# Altium footprint library Library.PcbLib: 308 footprints (part 6 of 21)
Each footprint in its own frame and in the unit in brackets; x right, y up, seen from the top. Pads: shape width x height; smd on the part's side, far side on the other; paste and mask are expansions set on the pad; w line width, h text height; cw(c..) or ccw(c..) is an arc to the next point about the centre after c.
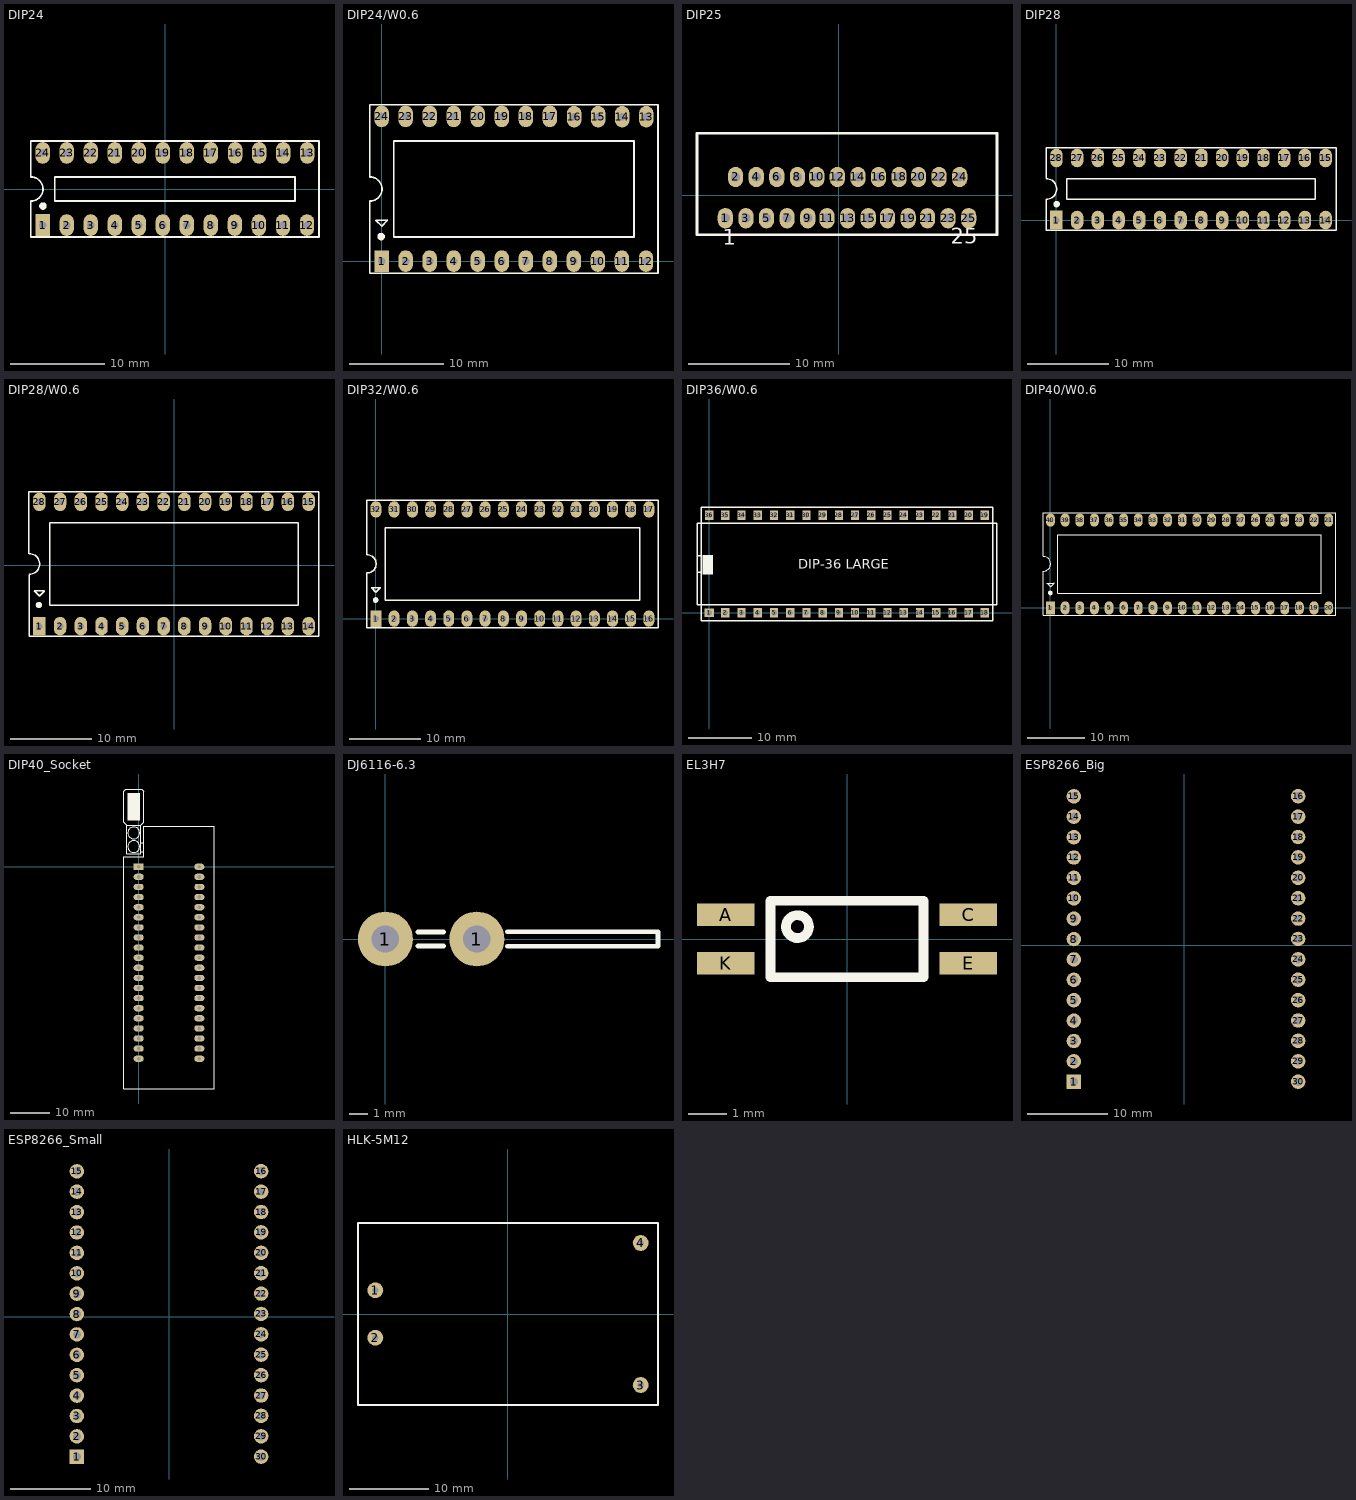
[diagram p5: the footprints below, top view; thin cyan lines are the x and y axes]

## DIP24 [mil]
height 100
pads (24):
  rect 60x90 hole 31: 1(-510,-150)
  oval 60x90 hole 31: 2(-410,-150) 3(-310,-150) 4(-210,-150) 5(-110,-150) 6(-10,-150) 7(90,-150) 8(190,-150) 9(290,-150) 10(390,-150) 11(490,-150) 12(590,-150) 13(591,150) 14(491,150) 15(391,150) 16(291,150) 17(190,150) 18(90,150) 19(-10,150) 20(-110,150) 21(-210,150) 22(-310,150) 23(-410,150) 24(-510,150)
Top Overlay:
  circle w15: c-509,-71 r8
  lines w7: -560.38,-49.95 ccw(c-558.68,0.02) -560,50 ; -560,-50 -560,-200 640,-200 640,200 -560,200 -560,51 ; -460,-50 -460,50 540,50 540,-50 -460,-50
3D body "SW3dPS-DIP24-300.STEP": height 200, standoff -98.03, extent -599.04,-152.92 671.04,156.92

## DIP24/W0.6 [mil] "DIP24/W.600, Pin to pin 100mil"
height 100
pads (24):
  rect 60x90 hole 31: 1(0,0)
  oval 60x90 hole 31: 2(100,0) 3(200,0) 4(300,0) 5(400,0) 6(500,0) 7(600,0) 8(700,0) 9(800,0) 10(900,0) 11(1000,0) 12(1100,0) 13(1101,601) 14(1001,601) 15(901,601) 16(801,601) 17(700,602) 18(600,602) 19(500,602) 20(400,602) 21(300,602) 22(200,602) 23(100,602) 24(0,602)
Top Overlay:
  circle w15: c-2,102 r8
  lines w7: -50,350 -50,650 1150,650 1150,-50 -50,-50 -50,250 ccw(c-48.31,299.97) -49.62,349.95 ; -25,170 23,170 24,171 24,169 0,145 0,146 -24,170 -25,170 ; 50,100 50,500 1050,500 1050,100 50,100
3D body "SW3DPS-DIP 24 IC WITH 0_280IN WINDOW-DEFAULT.STEP": height 227.95, standoff -129.92, extent -82.52,0.16 1202.52,600

## DIP25 [mm]
height 21
pads (25):
  oval 1.5x2 hole 0.9: 1(-11.176,-2.286) 2(-10.16,1.778) 3(-9.144,-2.286) 4(-8.128,1.778) 5(-7.112,-2.286) 6(-6.096,1.778) 7(-5.08,-2.286) 8(-4.064,1.778) 9(-3.048,-2.286) 10(-2.159,1.778) 11(-1.143,-2.286) 12(-0.127,1.778) 13(0.889,-2.286) 14(1.905,1.778) 15(2.921,-2.286) 16(3.937,1.778) 17(4.826,-2.286) 18(5.969,1.778) 19(6.858,-2.286) 20(7.874,1.778) 21(8.763,-2.286) 22(9.906,1.778) 23(10.795,-2.286) 24(11.938,1.778) 25(12.827,-2.286)
Top Overlay:
  lines w0.254: -13.97,-3.937 -13.97,6.096 15.621,6.096 15.621,-3.937 -13.97,-3.937
  text "25" at 11.049,-4.826 h1.5
  text "1" at -11.406,-4.911 h1.5
3D body "User Library-TDA73XX.step": height 20.95, standoff -1.92, extent -13.761,-2.54 15.539,5.97

## DIP28 [mil] "DIP, 18-Leads, Row Spacing 7.62mm, Pitch 2.54mm, Body 22.8x7.3mm, Window"
height 100
pads (28):
  rect 60x90 hole 31: 1(0,0)
  oval 60x90 hole 31: 2(100,0) 3(200,0) 4(300,0) 5(400,0) 6(500,0) 7(600,0) 8(700,0) 9(800,0) 10(900,0) 11(1000,0) 12(1100,0) 13(1200,0) 14(1300,0) 15(1300,300) 16(1200,300) 17(1100,300) 18(1000,300) 19(900,300) 20(800,300) 21(700,300) 22(600,300) 23(500,300) 24(400,300) 25(300,300) 26(200,300) 27(100,300) 28(0,300)
Top Overlay:
  circle w15: c1,77 r8
  lines w7: -50.38,100.05 ccw(c-48.69,150.02) -50,200 ; -50,100 -50,-50 1350,-50 1350,350 -50,350 -50,201 ; 50,100 1250,100 1250,200 50,200 50,100
3D body "SW3dPS-DIP28-300.STEP": height 200, standoff -98.03, extent -50,-10 1367.32,299.84

## DIP28/W0.6 [mil] "DIP28/W.600, Pin to pin 100mil"
height 100
pads (28):
  rect 60x90 hole 31: 1(-650,-295)
  oval 60x90 hole 31: 2(-550,-295) 3(-450,-295) 4(-350,-295) 5(-250,-295) 6(-150,-295) 7(-50,-295) 8(50,-295) 9(150,-295) 10(250,-295) 11(350,-295) 12(450,-295) 13(550,-295) 14(650,-295) 15(650,305) 16(550,305) 17(450,305) 18(350,305) 19(250,305) 20(150,305) 21(50,305) 22(-50,305) 23(-150,305) 24(-250,305) 25(-350,305) 26(-450,305) 27(-550,305) 28(-650,305)
Top Overlay:
  circle w15: c-652,-193 r8
  lines w7: -701,55 -701,355 700,355 700,-345 -700,-345 -700,-46 ; -700,-45 ccw(c-698.31,4.97) -699.62,54.95 ; -675,-125 -627,-125 -626,-124 -626,-126 -650,-150 -650,-149 -674,-125 -675,-125 ; -600,-195 -600,205 600,205 600,-195 -600,-195
3D body "SW3dPS-DIP28-600.STEP": height 224.41, standoff -101.57, extent -734.25,-294.84 734.25,315

## DIP32/W0.6 [mil] "DIP32/W.600, Pin to pin 100mil"
height 100
pads (32):
  rect 60x90 hole 31: 1(0,0)
  oval 60x90 hole 31: 2(100,0) 3(200,0) 4(300,0) 5(400,0) 6(500,0) 7(600,0) 8(700,0) 9(800,0) 10(900,0) 11(1000,0) 12(1100,0) 13(1200,0) 14(1300,0) 15(1400,0) 16(1500,0) 17(1500,600) 18(1400,600) 19(1300,600) 20(1200,600) 21(1100,600) 22(1000,600) 23(900,600) 24(800,600) 25(700,600) 26(600,600) 27(500,600) 28(400,600) 29(300,600) 30(200,600) 31(100,600) 32(0,600)
Top Overlay:
  circle w15: c-2,102 r8
  lines w7: -50.38,251.05 ccw(c-48.69,301.02) -50,351 ; -50,251 -50,-50 1550,-50 1550,650 -50,650 -50,352 ; -25,170 -24,170 0,146 0,145 24,169 24,171 23,170 -25,170 ; 50,100 50,500 1450,500 1450,100 50,100
3D body "SW3DPS-DIP 32 IC WITH 0_380IN WINDOW-DEFAULT.STEP": height 227.95, standoff -129.92, extent -77.56,0 1577.56,601.81

## DIP36/W0.6 [mil]
pads (36):
  rect 59x51 / inner rect 58x58 / far side rect 59x51 hole 34: 1(0,0)
  rect 51x59 / inner round 58 / far side rect 51x59 hole 34: 2(100,0) 3(200,0) 4(300,0) 5(400,0) 6(500,0) 7(600,0) 8(700,0) 9(800,0) 10(900,0) 11(1000,0) 12(1100,0) 13(1200,0) 14(1300,0) 15(1400,0) 16(1500,0) 17(1600,0) 18(1700,0) 19(1700,600) 20(1600,600) 21(1500,600) 22(1400,600) 23(1300,600) 24(1200,600) 25(1100,600) 26(1000,600) 27(900,600) 28(800,600) 29(700,600) 30(600,600) 31(500,600) 32(400,600) 33(300,600) 34(200,600) 35(100,600) 36(0,600)
Top Overlay:
  region: 22.4,236.65 22.4,356.73 -40,356.73 -40,236.65
  lines w8: -75,50 -75,250 ; -75,50 1775,50 ; -75,50 -75,250 ; -75,50 1775,50 ; -75,250 -50,250 ; -75,250 -75,350 ; -75,250 -50,250 ; -75,250 -75,350 ; -75,350 -50,350 ; -75,350 -75,550 ; -75,350 -50,350 ; -75,350 -75,550 ; -75,550 1775,550 ; -75,550 1775,550 ; -50,250 -50,350 ; -50,250 -50,350 ; -50,350 -50,650 1750,650 1750,-50 -50,-50 -50,350 ; 1775,50 1775,550 ; 1775,50 1775,550
  text "DIP-36 LARGE" at 550,270 h59.05
3D body: height 118.11, standoff 0, extent -75,50 1775,547.5
3D body "61301811021.stp": height 100.39, standoff -117.72, extent -50,206.06 1750,613.94
3D body "61301811021.stp": height 100.39, standoff -117.72, extent -50,-13.94 1750,393.94
3D body: height 119.11, standoff 118.11, extent -24.98,74.93 -4.99,94.93
3D body: height 120.08, standoff 0, extent -37,230 29,361

## DIP40/W0.6 [mil] "40 PIN, W 600mil, Pin to pin 100mil"
height 100
pads (40):
  rect 60x90 hole 31: 1(0,0)
  oval 60x90 hole 31: 2(100,0) 3(200,0) 4(300,0) 5(400,0) 6(500,0) 7(600,0) 8(700,0) 9(800,0) 10(900,0) 11(1000,0) 12(1100,0) 13(1200,0) 14(1300,0) 15(1400,0) 16(1500,0) 17(1600,0) 18(1700,0) 19(1800,0) 20(1900,0) 21(1900,600) 22(1800,600) 23(1700,600) 24(1600,600) 25(1500,600) 26(1400,600) 27(1300,600) 28(1200,600) 29(1100,600) 30(1000,600) 31(900,600) 32(800,600) 33(700,600) 34(600,600) 35(500,600) 36(400,600) 37(300,600) 38(200,600) 39(100,600) 40(0,600)
Top Overlay:
  circle w15: c-1,102 r8
  lines w7: -50.38,251.05 ccw(c-48.69,301.02) -50,351 ; -50,251 -50,-50 1950,-50 1950,650 -50,650 -50,352 ; -24,170 -23,170 1,146 1,145 25,169 25,171 24,170 -24,170 ; 50,100 1850,100 1850,500 50,500 50,100
3D body "SW3dPS-DIP40-600.STEP": height 224.41, standoff -101.57, extent -82.48,-10 1982.48,599.84

## DIP40_Socket [mil] "40 PIN, W 900 mil , L 2600 mil , Push Pro FOR Chip"
height 300
pads (40):
  rect 100x62 hole 38: 1(0,0)
  oval 100x62 hole 38: 2(0,-100) 3(0,-200) 4(0,-300) 5(0,-400) 6(0,-500) 7(0,-600) 8(0,-700) 9(0,-800) 10(0,-900) 11(0,-1000) 12(0,-1100) 13(0,-1200) 14(0,-1300) 15(0,-1400) 16(0,-1500) 17(0,-1600) 18(0,-1700) 19(0,-1800) 20(0,-1900) 21(600,-1900) 22(600,-1800) 23(600,-1700) 24(600,-1600) 25(600,-1500) 26(600,-1400) 27(600,-1300) 28(600,-1200) 29(600,-1100) 30(600,-1000) 31(600,-900) 32(600,-800) 33(600,-700) 34(600,-600) 35(600,-500) 36(600,-400) 37(600,-300) 38(600,-200) 39(600,-100) 40(600,0)
Top Overlay:
  circle w7: c-48.31,335 r58.31
  circle w7: c-48.31,200 r58.31
  rectangle: -110,460 15,730
  lines w7: 20,150 50,150 ; 20,240 50,240 ; -120,410 -120,130 -110,130 20,130 20,410 ; -120,410 -150,440 -150,750 -130,770 30,770 50,750 50,440 20,410 ; -120,410 20,410 ; -150,-2200 -150,100 50,100 50,400 600,400 750,400 750,-2200 -150,-2200
3D body "SW3dPS-zif.STEP": height 443.07, standoff -186.85, extent -189.6,-2144.51 750,894.51

## DJ6116-6.3 [mm] "Faston 6,3x0,8mm; fork; to PCB; 90°; tinned"
pads (2):
  round 3 hole 1.5: 1(0,0) 1(5,0)
Top Overlay:
  lines w0.254: 1.778,-0.381 3.175,-0.381 ; 1.778,0.381 3.175,0.381 ; 6.65,-0.4 14.9,-0.4 14.9,0.4 6.65,0.4
3D body "DJ6116-6.3x0.8.step": height 9.5, standoff -3, extent -1.6,-0.4 14.9,0.4

## EL3H7 [mm] "OPTO"
pads (4):
  rect 1.5x0.6 smd: A(-3.175,0.635) C(3.175,0.635) E(3.175,-0.635) K(-3.175,-0.635)
Top Overlay:
  circle w0.254: c-1.296,0.323 r0.3
  lines w0.254: -2,-1 2,-1 2,1 -2,1 -2,-1
3D body "User Library-PC3H7.step": height 2.02, standoff -0.03, extent -3.5,-1.3 3.5,1.3

## ESP8266_Big [mm]
pads (30):
  rect 1.8x1.8 hole 1.02: 1(-13.769,-17.029)
  round 1.8 hole 1.02: 2(-13.769,-14.489) 3(-13.769,-11.949) 4(-13.769,-9.409) 5(-13.769,-6.869) 6(-13.769,-4.329) 7(-13.769,-1.789) 8(-13.769,0.751) 9(-13.769,3.291) 10(-13.769,5.831) 11(-13.769,8.371) 12(-13.769,10.911) 13(-13.769,13.451) 14(-13.769,15.991) 15(-13.769,18.531) 16(14.174,18.544) 17(14.174,16.004) 18(14.174,13.464) 19(14.174,10.924) 20(14.174,8.384) 21(14.174,5.844) 22(14.174,3.304) 23(14.174,0.764) 24(14.174,-1.776) 25(14.174,-4.316) 26(14.174,-6.856) 27(14.174,-9.396) 28(14.174,-11.936) 29(14.174,-14.476) 30(14.174,-17.016)
3D body "61301511821.stp": height 8.51, standoff -3.09, extent 12.924,-18.54 15.424,19.56
3D body "User Library-Lolin NodeMCU ESP8266 V3.STEP": height 15.6, standoff 2.46, extent -15.55,-30.192 15.95,29.788
3D body "61301511821.stp": height 8.51, standoff -3.09, extent -15.019,-18.553 -12.519,19.547

## ESP8266_Small [mm] "NodeMCU"
pads (30):
  rect 1.8x1.8 hole 1.02: 1(-11.476,-17.454)
  round 1.8 hole 1.02: 2(-11.476,-14.914) 3(-11.476,-12.374) 4(-11.476,-9.834) 5(-11.476,-7.294) 6(-11.476,-4.754) 7(-11.476,-2.214) 8(-11.476,0.326) 9(-11.476,2.866) 10(-11.476,5.406) 11(-11.476,7.946) 12(-11.476,10.486) 13(-11.476,13.026) 14(-11.476,15.566) 15(-11.476,18.106) 16(11.467,18.119) 17(11.467,15.579) 18(11.467,13.039) 19(11.467,10.499) 20(11.467,7.959) 21(11.467,5.419) 22(11.467,2.879) 23(11.467,0.339) 24(11.467,-2.201) 25(11.467,-4.741) 26(11.467,-7.281) 27(11.467,-9.821) 28(11.467,-12.361) 29(11.467,-14.901) 30(11.467,-17.441)
3D body "61301511821.stp": height 8.51, standoff -3.09, extent 10.217,-18.965 12.717,19.135
3D body "61301511821.stp": height 8.51, standoff -3.09, extent -12.726,-18.978 -10.226,19.122
3D body "User Library-NODEMCU_DEVKIT_V1_0.STEP": height -3.58, standoff -15.77, extent -12.909,-24.755 12.871,24.239

## FAN 3030 [mm] "FAN"
3D body "Fan.STEP": height 22.5, standoff 16, extent -15.1,-15.1 15.1,15.1

## FAN 4040 [mm] "FAN"
3D body "Cooler Blades.SLDPRT": height 20.5, standoff 12, extent -18.235,-18.493 17.734,18.002
3D body "Cooler Motor.SLDPRT": height 19.5, standoff 11, extent -8.985,-9.245 9.015,8.755
3D body "Cooler pcb.SLDPRT": height 17.01, standoff 11.4, extent -19.856,-23.642 14.685,14.685
3D body "Sticker SUNON.SLDPRT": height 11, standoff 10.93, extent -8.985,-9.24 9.015,8.755
3D body "Cooler 40x40x10 body.SLDPRT": height 21.5, standoff 11, extent -20,-20 20,20

## HLK-5M12 [mm] "12V/5W"
pads (4):
  round 2 hole 0.8: 1(-16.8,3) 2(-16.8,-3) 3(16.8,-9) 4(16.8,9)
Top Overlay:
  lines w0.254: -19,11.5 19,11.5 19,-11.5 -19,-11.5 -19,11.5 ; -19,11.5 -19,11.5
3D body "User Library-hilink5M.STEP": height 18.31, standoff -4.7, extent -19,-11.5 19,11.5